# Altium footprint library MyPcbLib.PcbLib: 278 footprints (part 1 of 18)
Each footprint in its own frame and in the unit in brackets; x right, y up, seen from the top. Pads: shape width x height; smd on the part's side, far side on the other; paste and mask are expansions set on the pad; w line width, h text height; cw(c..) or ccw(c..) is an arc to the next point about the centre after c.
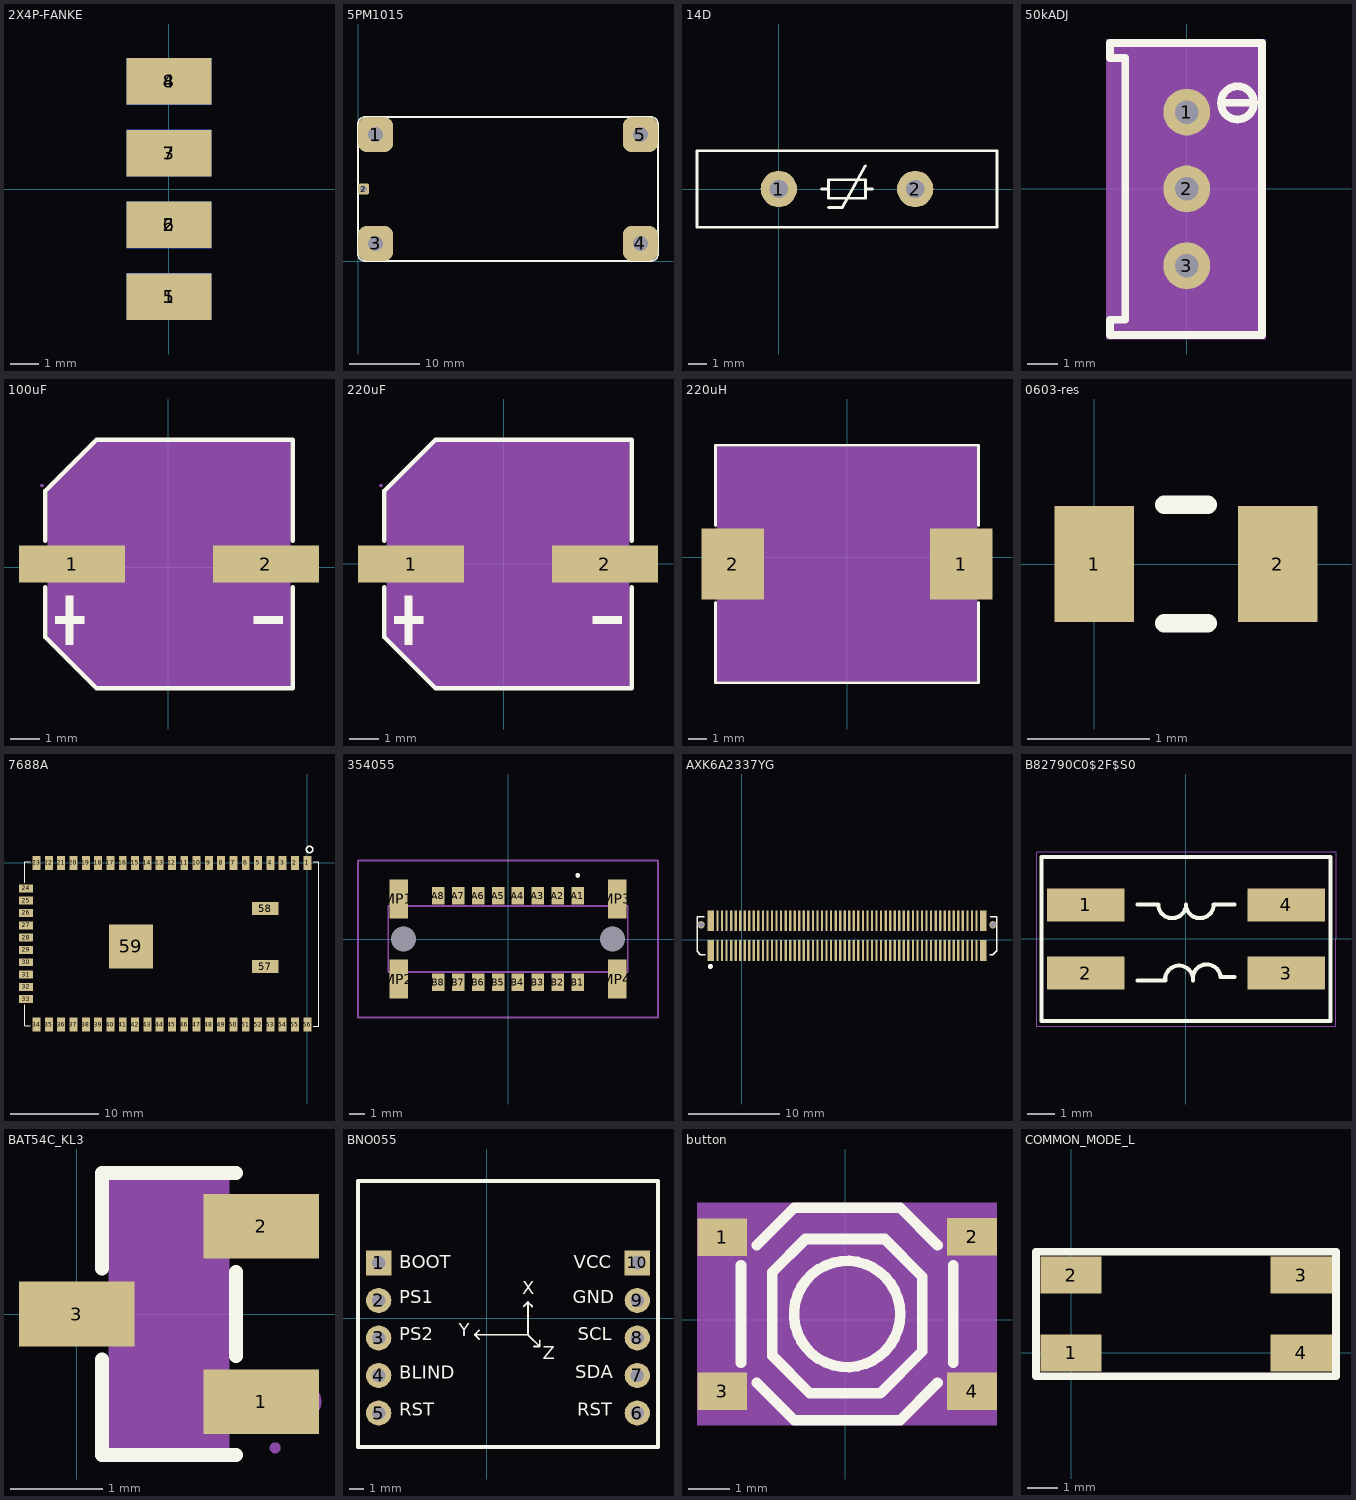
[diagram p0: the footprints below, top view; thin cyan lines are the x and y axes]

## 2X4P-FANKE [mm]
pads (8):
  rect 3x1.65 smd: 1(0,-3.81) 2(0,-1.27) 3(0,1.27) 4(0,3.81)
  rect 3x1.65 smd far side: 5(0,-3.81) 6(0,-1.27) 7(0,1.27) 8(0,3.81)
3D body "User Library-2_54mm Male Header (4x2).STEP": height 1.84, standoff -3.14, extent -1.249,-5.08 10.291,5.08

## 5PM1015 [mm] "5A输出电源模块"
pads (5):
  rrect50% 5x5 hole 2.1: 1(2.5,18) 3(2.5,2.5) 4(40.2,2.5) 5(40.2,18)
  rrect50% 1.6x1.6 hole 1: 2(0.8,10.25)
Top Overlay:
  lines w0.254: 0,1 ccw(c1,1) 1,0 41.7,0 ccw(c41.7,1) 42.7,1 42.7,19.5 ccw(c41.7,19.5) 41.7,20.5 1,20.5 ccw(c1,19.5) 0,19.5 0,1

## 14D [mm]
pads (2):
  round 2 hole 1: 1(0,0) 2(7.5,0)
Top Overlay:
  lines w0.152: 2.353,0 2.734,0 ; 2.734,-1.016 3.496,-1.016 4.766,1.27 ; 4.766,0 5.147,0 ; -4.5,-2.1 12,-2.1 12,2.1 -4.5,2.1 -4.5,-2.1 ; 2.734,-0.508 2.734,0.508 4.766,0.508 4.766,-0.508 2.734,-0.508

## 50kADJ [mil]
pads (3):
  round 60 hole 30: 1(0,98.42) 2(0,0) 3(0,-98.42)
Top Overlay:
  lines w10: 50,110.39 65,110.39 ; 86.2,109.99 cw(c64.99,110.19) 86.2,110.4 ; 96.46,-187.22 -96.46,-187.22 -98.42,-187.22 -98.42,-167.52 -78.74,-167.52 -78.74,167.52 -98.42,167.52 -98.42,187.01 -96.46,187.01 96.46,187.01 96.46,-187.01 ; 65,110.39 80,110.39 65,110.39
Mechanical 4:
  region: -103.42,192.01 101.46,192.01 101.46,-192.22 -103.42,-192.22
Mechanical 5:
  region: -30,-68.42 30,-68.42 30,-128.43 -30,-128.43
  region: -30,128.43 30,128.43 30,68.42 -30,68.42
  region: -30,30 30,30 30,-30 -30,-30
Mechanical 15:
  lines w0.1: -1.98,14.34 0.02,16.34

## 100uF [mm]
pads (2):
  rect 3.61x1.26 smd: 1(-3.275,0.111) 2(3.315,0.111)
Top Overlay:
  region: 3.896,-1.673 3.896,-1.922 2.9,-1.922 2.9,-1.673
  region: -3.856,-1.673 -3.856,-1.922 -2.86,-1.922 -2.86,-1.673
  region: -3.483,-0.968 -3.483,-2.628 -3.234,-2.628 -3.234,-0.968
  lines w0.152: -4.181,-0.671 -4.181,-2.379 -2.445,-4.115 4.221,-4.115 4.221,-0.671 ; -4.181,0.894 -4.181,2.601 -2.445,4.338 4.221,4.338 4.221,0.894
Mechanical 4:
  region: 4.145,4.261 4.145,-4.039 -2.445,-4.039 -4.105,-2.379 -4.105,2.601 -2.445,4.261
Mechanical 5:
  region: 4.52,0.561 4.52,-0.339 1.57,-0.339 1.57,0.561
  region: -4.48,0.561 -4.48,-0.339 -1.53,-0.339 -1.53,0.561
Mechanical 6:
  circle w0.06: c-4.298,2.778 r0.03
Mechanical 15:
  region: 3.896,0.236 3.896,-0.013 2.9,-0.013 2.9,0.236
  region: -3.856,0.236 -3.856,-0.013 -2.86,-0.013 -2.86,0.236
  region: -3.483,0.941 -3.483,-0.719 -3.234,-0.719 -3.234,0.941

## 220uF [mm]
pads (2):
  rect 3.61x1.26 smd: 1(-3.148,-0.016) 2(3.442,-0.016)
Top Overlay:
  region: -3.356,-1.095 -3.356,-2.755 -3.107,-2.755 -3.107,-1.095
  region: -3.729,-1.8 -3.729,-2.049 -2.733,-2.049 -2.733,-1.8
  region: 4.023,-1.8 4.023,-2.049 3.027,-2.049 3.027,-1.8
  lines w0.152: -4.054,-0.798 -4.054,-2.506 -2.318,-4.242 4.348,-4.242 4.348,-0.798 ; -4.054,0.767 -4.054,2.474 -2.318,4.211 4.348,4.211 4.348,0.767
Mechanical 4:
  region: 4.272,4.134 4.272,-4.166 -2.318,-4.166 -3.978,-2.506 -3.978,2.474 -2.318,4.134
Mechanical 5:
  region: -4.353,0.434 -4.353,-0.466 -1.403,-0.466 -1.403,0.434
  region: 4.647,0.434 4.647,-0.466 1.697,-0.466 1.697,0.434
Mechanical 6:
  circle w0.06: c-4.171,2.651 r0.03
Mechanical 15:
  region: -3.356,0.814 -3.356,-0.846 -3.107,-0.846 -3.107,0.814
  region: -3.729,0.109 -3.729,-0.14 -2.733,-0.14 -2.733,0.109
  region: 4.023,0.109 4.023,-0.14 3.027,-0.14 3.027,0.109

## 220uH [mm]
pads (2):
  rect 3.424x3.92 smd: 1(6.267,-0.383) 2(-6.289,-0.383)
Top Overlay:
  lines w0.152: -7.237,-2.495 -7.237,-6.909 7.215,-6.909 7.215,-2.495 ; -7.237,1.73 -7.237,6.144 7.215,6.144 7.215,1.73
Mechanical 4:
  region: -7.161,-6.833 -7.161,6.067 7.139,6.067 7.139,-6.833
Mechanical 5:
  region: 7.139,-2.133 7.139,1.367 4.639,1.367 4.639,-2.133
  region: -7.161,-2.133 -7.161,1.367 -4.661,1.367 -4.661,-2.133
Mechanical 6:
  circle w0.06: c-7.161,-6.833 r0.03
Mechanical 15:
  lines w0.003: -0.036,0.006 0.014,0.056

## 0603-res [mm]
height 0.35
pads (2):
  rect 0.65x0.95 smd: 1(0,0) 2(1.5,0)
Top Overlay:
  lines w0.152: 0.572,-0.483 0.928,-0.483 ; 0.572,0.483 0.928,0.483
3D body "0603-res.step": height 0.35, standoff 0, extent -0.125,-0.475 1.625,0.475

## 7688A [mm]
height 2.5
pads (59):
  rect 0.9x1.6 smd: 1(0,0) 2(-1.4,0) 3(-2.8,0) 4(-4.2,0) 5(-5.6,0) 6(-7,0) 7(-8.4,0) 8(-9.8,0) 9(-11.2,0) 10(-12.6,0) 11(-14,0) 12(-15.4,0) 13(-16.8,0) 14(-18.2,0) 15(-19.6,0) 16(-21,0) 17(-22.4,0) 18(-23.8,0) 19(-25.2,0) 20(-26.6,0) 21(-28,0) 22(-29.4,0) 23(-30.8,0) 34(-30.8,-18.4) 35(-29.4,-18.4) 36(-28,-18.4) 37(-26.6,-18.4) 38(-25.2,-18.4) 39(-23.8,-18.4) 40(-22.4,-18.4) 41(-21,-18.4) 42(-19.6,-18.4) 43(-18.2,-18.4) 44(-16.8,-18.4) 45(-15.4,-18.4) 46(-14,-18.4) 47(-12.6,-18.4) 48(-11.2,-18.4) 49(-9.8,-18.4) 50(-8.4,-18.4) 51(-7,-18.4) 52(-5.6,-18.4) 53(-4.2,-18.4) 54(-2.8,-18.4) 55(-1.4,-18.4) 56(0,-18.4)
  rect 1.6x0.9 smd: 24(-32,-2.9) 25(-32,-4.3) 26(-32,-5.7) 27(-32,-7.1) 28(-32,-8.5) 29(-32,-9.9) 30(-32,-11.3) 31(-32,-12.7) 32(-32,-14.1) 33(-32,-15.5)
  rect 3x1.5 smd: 57(-4.8,-11.8) 58(-4.8,-5.2)
  rect 5x5 smd: 59(-20.066,-9.5)
Top Overlay:
  circle w0.15: c0.254,1.524 r0.359
  lines w0.1: -32.131,-16.129 -32.131,-18.542 -31.496,-18.542 ; -32.131,-2.271 -32.131,0.142 -31.496,0.142 ; 0.696,-18.557 1.331,-18.557 1.331,0.142 0.696,0.142

## 354055 [mm]
pads (22):
  rect 0.8x1.1 smd: A1(4.445,2.75) A2(3.175,2.75) A3(1.905,2.75) A4(0.635,2.75) A5(-0.635,2.75) A6(-1.905,2.75) A7(-3.175,2.75) A8(-4.445,2.75) B1(4.445,-2.75) B2(3.175,-2.75) B3(1.905,-2.75) B4(0.635,-2.75) B5(-0.635,-2.75) B6(-1.905,-2.75) B7(-3.175,-2.75) B8(-4.445,-2.75)
  round 0.8 hole 1.6 unplated: MH1(-6.655,0) MH2(6.655,0)
  rect 1.2x2.5 smd: MP1(-6.955,2.55) MP2(-6.955,-2.55) MP3(6.955,2.55) MP4(6.955,-2.55)
Top Overlay:
  lines w0.2: 4.445,4 ccw(c4.445,4.05) 4.445,4.1 ; 4.445,4 cw(c4.445,4.05) 4.445,4.1 ; 4.445,4 ccw(c4.445,4.05) 4.445,4.1
Mechanical 15:
  lines w0.1: -7.62,-2.1 -7.62,2.1 7.62,2.1 7.62,-2.1 -7.62,-2.1
Bottom Assembly:
  lines w0.1: -9.555,-5 -9.555,5 9.555,5 9.555,-5 -9.555,-5
3D body "354055.stp": height 5.8, standoff -4.65, extent -10,-3.376 10,3.376

## AXK6A2337YG [mm] "AXK6A2337YG-120PIN"
pads (122):
  round 0.8 hole 0.65: 1(-4.475,1.624) 2(27.625,1.624)
  rect 0.75x2.3 smd: 1(-3.425,-1.226) 2(-3.425,2.074) 119(26.575,-1.226) 120(26.575,2.074)
  rect 0.25x2.3 smd: 3(-2.675,-1.226) 4(-2.675,2.074) 5(-2.175,-1.226) 6(-2.175,2.074) 7(-1.675,-1.226) 8(-1.675,2.074) 9(-1.175,-1.226) 10(-1.175,2.074) 11(-0.675,-1.226) 12(-0.675,2.074) 13(-0.175,-1.226) 14(-0.175,2.074) 15(0.325,-1.226) 16(0.325,2.074) 17(0.825,-1.226) 18(0.825,2.074) 19(1.325,-1.226) 20(1.325,2.074) 21(1.825,-1.226) 22(1.825,2.074) 23(2.325,-1.226) 24(2.325,2.074) 25(2.825,-1.226) 26(2.825,2.074) 27(3.325,-1.226) 28(3.325,2.074) 29(3.825,-1.226) 30(3.825,2.074) 31(4.325,-1.226) 32(4.325,2.074) 33(4.825,-1.226) 34(4.825,2.074) 35(5.325,-1.226) 36(5.325,2.074) 37(5.825,-1.226) 38(5.825,2.074) 39(6.325,-1.226) 40(6.325,2.074) 41(6.825,-1.226) 42(6.825,2.074) 43(7.325,-1.226) 44(7.325,2.074) 45(7.825,-1.226) 46(7.825,2.074) 47(8.325,-1.226) 48(8.325,2.074) 49(8.825,-1.226) 50(8.825,2.074) 51(9.325,-1.226) 52(9.325,2.074) 53(9.825,-1.226) 54(9.825,2.074) 55(10.325,-1.226) 56(10.325,2.074) 57(10.825,-1.226) 58(10.825,2.074) 59(11.325,-1.226) 60(11.325,2.074) 61(11.825,-1.226) 62(11.825,2.074) 63(12.325,-1.226) 64(12.325,2.074) 65(12.825,-1.226) 66(12.825,2.074) 67(13.325,-1.226) 68(13.325,2.074) 69(13.825,-1.226) 70(13.825,2.074) 71(14.325,-1.226) 72(14.325,2.074) 73(14.825,-1.226) 74(14.825,2.074) 75(15.325,-1.226) 76(15.325,2.074) 77(15.825,-1.226) 78(15.825,2.074) 79(16.325,-1.226) 80(16.325,2.074) 81(16.825,-1.226) 82(16.825,2.074) 83(17.325,-1.226) 84(17.325,2.074) 85(17.825,-1.226) 86(17.825,2.074) 87(18.325,-1.226) 88(18.325,2.074) 89(18.825,-1.226) 90(18.825,2.074) 91(19.325,-1.226) 92(19.325,2.074) 93(19.825,-1.226) 94(19.825,2.074) 95(20.325,-1.226) 96(20.325,2.074) 97(20.825,-1.226) 98(20.825,2.074) 99(21.325,-1.226) 100(21.325,2.074) 101(21.825,-1.226) 102(21.825,2.074) 103(22.325,-1.226) 104(22.325,2.074) 105(22.825,-1.226) 106(22.825,2.074) 107(23.325,-1.226) 108(23.325,2.074) 109(23.825,-1.226) 110(23.825,2.074) 111(24.325,-1.226) 112(24.325,2.074) 113(24.825,-1.226) 114(24.825,2.074) 115(25.325,-1.226) 116(25.325,2.074) 117(25.825,-1.226) 118(25.825,2.074)
Top Overlay:
  lines w0.152: -4.122,2.524 -4.929,2.524 -4.929,-1.301 -4.554,-1.676 -4.046,-1.676 ; 27.272,-1.676 27.63,-1.676 28.079,-1.227 28.079,2.524 27.349,2.524
  lines w0.254: -3.61,-2.954 ccw(c-3.462,-2.954) -3.61,-2.947
Mechanical 1:
  text "117" at 25.825,-1.988 h0.64
  text "111" at 24.325,-1.988 h0.64
  text "115" at 25.325,-1.988 h0.64
  text "113" at 24.825,-1.988 h0.64
  text "100" at 21.325,1.312 h0.64
  text "9" at -1.203,-0.846 h0.64
  text "10" at -1.175,1.566 h0.64
  text "20" at 1.325,1.566 h0.64
  text "19" at 1.325,-1.734 h0.64
  text "30" at 3.825,1.566 h0.64
  text "29" at 3.825,-1.734 h0.64
  text "39" at 6.325,-1.734 h0.64
  text "49" at 8.825,-1.734 h0.64
  text "50" at 8.825,1.566 h0.64
  text "60" at 11.325,1.566 h0.64
  text "59" at 11.325,-1.734 h0.64
  text "70" at 13.825,1.566 h0.64
  text "69" at 13.825,-1.734 h0.64
  text "80" at 16.325,1.566 h0.64
  text "79" at 16.325,-1.734 h0.64
  text "89" at 18.825,-1.734 h0.64
  text "90" at 18.825,1.566 h0.64
  text "99" at 21.325,-1.734 h0.64
  text "110" at 23.825,1.312 h0.64
  text "109" at 23.825,-1.988 h0.64
  text "40" at 6.325,1.566 h0.64
  text "78" at 15.825,1.566 h0.64
  text "76" at 15.325,1.566 h0.64
  text "74" at 14.825,1.566 h0.64
  text "72" at 14.325,1.566 h0.64
  text "68" at 13.325,1.566 h0.64
  text "66" at 12.825,1.566 h0.64
  text "77" at 15.825,-1.734 h0.64
  text "75" at 15.325,-1.734 h0.64
  text "64" at 12.402,1.576 h0.64
  text "62" at 11.825,1.566 h0.64
  text "58" at 10.825,1.566 h0.64
  text "56" at 10.325,1.566 h0.64
  text "63" at 12.325,-1.734 h0.64
  text "61" at 12.085,-1.598 h0.64
  text "67" at 13.325,-1.734 h0.64
  text "65" at 12.825,-1.734 h0.64
  text "54" at 9.825,1.566 h0.64
  text "52" at 9.325,1.566 h0.64
  text "48" at 8.325,1.566 h0.64
  text "46" at 7.825,1.566 h0.64
  text "57" at 10.825,-1.734 h0.64
  text "55" at 10.325,-1.734 h0.64
  text "53" at 9.825,-1.734 h0.64
  text "51" at 9.325,-1.734 h0.64
  text "47" at 8.325,-1.734 h0.64
  text "45" at 7.825,-1.734 h0.64
  text "41" at 6.825,-1.734 h0.64
  text "27" at 3.325,-1.734 h0.64
  text "25" at 2.825,-1.734 h0.64
  text "23" at 2.325,-1.734 h0.64
  text "21" at 1.825,-1.734 h0.64
  text "43" at 7.325,-1.734 h0.64
  text "31" at 4.325,-1.734 h0.64
  text "33" at 4.825,-1.734 h0.64
  text "42" at 7.082,1.697 h0.64
  text "44" at 7.325,1.566 h0.64
  text "2" at -3.425,2.455 h0.64
  text "4" at -2.493,2.398 h0.64
  text "6" at -2.203,2.454 h0.64
  text "8" at -1.675,2.455 h0.64
  text "5" at -2.175,-0.845 h0.64
  text "1" at -3.425,-0.845 h0.64
  text "3" at -2.675,-0.845 h0.64
  text "7" at -1.735,-0.851 h0.64
  text "112" at 24.325,1.312 h0.64
  text "24" at 2.325,1.566 h0.64
  text "34" at 4.825,1.566 h0.64
  text "22" at 1.825,1.566 h0.64
  text "38" at 5.825,1.566 h0.64
  text "26" at 2.825,1.566 h0.64
  text "36" at 5.325,1.566 h0.64
  text "32" at 4.325,1.566 h0.64
  text "28" at 3.325,1.566 h0.64
  text "18" at 0.825,1.566 h0.64
  text "16" at 0.325,1.566 h0.64
  text "14" at -0.175,1.566 h0.64
  text "12" at -0.675,1.566 h0.64
  text "11" at -0.357,-1.416 h0.64
  text "13" at -0.175,-1.734 h0.64
  text "15" at 0.325,-1.734 h0.64
  text "17" at 0.825,-1.734 h0.64
  text "114" at 24.913,1.325 h0.64
  text "118" at 25.825,1.312 h0.64
  text "116" at 25.325,1.312 h0.64
  text "119" at 26.575,-1.988 h0.64
  text "122" at 27.625,0.862 h0.64
  text "121" at -4.475,0.862 h0.64
  text "120" at 26.575,1.312 h0.64
  text "106" at 22.825,1.312 h0.64
  text "102" at 21.825,1.312 h0.64
  text "83" at 17.325,-1.734 h0.64
  text "105" at 22.825,-1.988 h0.64
  text "81" at 16.825,-1.734 h0.64
  text "87" at 18.325,-1.734 h0.64
  text "104" at 22.325,1.312 h0.64
  text "98" at 20.825,1.566 h0.64
  text "85" at 17.825,-1.734 h0.64
  text "96" at 20.325,1.566 h0.64
  text "107" at 23.325,-1.988 h0.64
  text "93" at 19.836,-1.734 h0.64
  text "108" at 23.325,1.312 h0.64
  text "103" at 22.325,-1.988 h0.64
  text "101" at 21.825,-1.988 h0.64
  text "91" at 19.582,-1.603 h0.64
  text "37" at 5.825,-1.734 h0.64
  text "94" at 19.902,1.576 h0.64
  text "92" at 19.325,1.566 h0.64
  text "86" at 17.825,1.566 h0.64
  text "88" at 18.325,1.566 h0.64
  text "84" at 17.325,1.566 h0.64
  text "82" at 16.825,1.566 h0.64
  text "71" at 14.325,-1.734 h0.64
  text "35" at 5.325,-1.734 h0.64
  text "73" at 14.825,-1.734 h0.64
  text "97" at 20.825,-1.734 h0.64
  text "95" at 20.325,-1.734 h0.64
Mechanical 15:
  lines w0.003: 12.459,0.163 12.51,0.214

## B82790C0$2F$S0 [mm]
height 6
pads (4):
  rect 2.85x1.2 smd mask+0.05: 1(-3.675,1.25) 2(-3.675,-1.25) 3(3.675,-1.25) 4(3.675,1.25)
Top Overlay:
  lines w0.013: -5.3,-3 5.3,-3 5.3,3 -5.3,3 -5.3,-3
  lines w0.15: -1.778,-1.524 -0.762,-1.524 cw(c-0.254,-1.485) 0.254,-1.524 0.254,-1.365 cw(c0.76,-1.444) 1.27,-1.4 1.778,-1.4 ; -1.778,1.27 -1.016,1.27 ccw(c-0.508,1.27) 0,1.27 ccw(c0.508,1.27) 1.016,1.27 1.778,1.27 ; -5.3,-3 5.3,-3 5.3,3 -5.3,3 -5.3,-3
Mechanical 1:
  lines w0.013: -5.5,-3.2 5.5,-3.2 5.5,3.2 -5.5,3.2 -5.5,-3.2

## BAT54C_KL3 [mm]
pads (3):
  rect 1.25x0.7 smd: 1(2,-0.95) 2(2,0.95) 3(0,0)
Top Overlay:
  lines w0.152: 0.274,-0.495 0.274,-1.526 1.726,-1.526 ; 0.274,0.495 0.274,1.526 1.726,1.526 ; 1.726,-0.455 1.726,0.455
Mechanical 4:
  region: 0.35,-1.45 0.35,1.45 1.65,1.45 1.65,-1.45
Mechanical 5:
  region: 1.85,-1.165 1.85,-0.735 2.15,-0.735 2.15,-1.165
  pour cut-out: 1.64,-1.165 1.64,-0.735 1.86,-0.735 1.86,-1.165
  region: 1.85,0.735 1.85,1.165 2.15,1.165 2.15,0.735
  pour cut-out: 1.64,0.735 1.64,1.165 1.86,1.165 1.86,0.735
  region: 0.15,-0.215 0.15,0.215 -0.15,0.215 -0.15,-0.215
  pour cut-out: 0.14,-0.215 0.14,0.215 0.36,0.215 0.36,-0.215
Mechanical 6:
  circle w0.06: c2.15,-1.45 r0.03
Mechanical 15:
  circle w0.2: c2.45,-0.95 r0.1

## BNO055 [mm] "DFROBOT-BNO055模块"
pads (10):
  rect 1.7x1.7 hole 0.9: 1(-7.3,3.76) 10(10.2,3.76)
  round 1.7 hole 0.9: 2(-7.3,1.22) 3(-7.3,-1.32) 4(-7.3,-3.86) 5(-7.3,-6.4) 6(10.2,-6.4) 7(10.2,-3.86) 8(10.2,-1.32) 9(10.2,1.22)
Top Overlay:
  lines w0.127: -0.517,-1.383 -0.8,-1.1 ; -0.517,-0.817 -0.8,-1.1 ; 2.517,0.817 2.8,1.1 ; 3.083,0.817 2.8,1.1 ; 3.2,-1.9 3.6,-1.9 ; 3.6,-1.5 3.6,-1.9 ; -0.8,-1.1 2.8,-1.1 ; 2.8,-1.1 2.8,1.1 ; 2.8,-1.1 3.6,-1.9 ; 3.6,-1.9 3.6,-1.9
  lines w0.254: -8.7,-8.7 -8.7,9.3 11.6,9.3 11.6,-8.7 -8.7,-8.7
  text "PS1" at -5.9,0.717 h1.52
  text "RST" at -5.9,-6.883 h1.52
  text "PS2" at -5.9,-1.766 h1.52
  text "BLIND" at -5.9,-4.383 h1.52
  text "BOOT" at -5.9,3.077 h1.52
  text "GND" at 5.843,0.717 h1.52
  text "SCL" at 6.185,-1.766 h1.52
  text "RST" at 6.136,-6.883 h1.52
  text "VCC" at 5.909,3.077 h1.52
  text "SDA" at 5.985,-4.366 h1.52
  text "Y" at -1.899,-1.5 h1.52
  text "X" at 2.399,1.317 h1.52
  text "Z" at 3.799,-3.083 h1.52
3D body "HDR2.54-1P_M.STEP": height 8.5, standoff -3, extent -8.57,-7.67 -6.03,-5.13
3D body "HDR2.54-1P_M.STEP": height 8.5, standoff -3, extent -8.57,-5.13 -6.03,-2.59
3D body "HDR2.54-1P_M.STEP": height 8.5, standoff -3, extent -8.57,-0.05 -6.03,2.49
3D body "HDR2.54-1P_M.STEP": height 8.5, standoff -3, extent -8.57,2.49 -6.03,5.03
3D body "HDR2.54-1P_M.STEP": height 8.5, standoff -3, extent -8.57,-2.59 -6.03,-0.05
3D body "HDR2.54-1P_M.STEP": height 8.5, standoff -3, extent 8.93,-7.67 11.47,-5.13
3D body "HDR2.54-1P_M.STEP": height 8.5, standoff -3, extent 8.93,-5.13 11.47,-2.59
3D body "HDR2.54-1P_M.STEP": height 8.5, standoff -3, extent 8.93,-0.05 11.47,2.49
3D body "HDR2.54-1P_M.STEP": height 8.5, standoff -3, extent 8.93,2.49 11.47,5.03
3D body "HDR2.54-1P_M.STEP": height 8.5, standoff -3, extent 8.93,-2.59 11.47,-0.05

## button [mm]
pads (4):
  rect 1.2x0.9 smd: 1(-2.949,1.986) 2(3.051,1.988) 3(-2.949,-1.713) 4(3.051,-1.713)
Top Overlay:
  circle w0.254: c0.051,0.137 r1.275
  lines w0.254: -2.499,-1.031 -2.499,1.306 ; -2.119,-1.518 -1.224,-2.413 1.326,-2.413 2.221,-1.518 ; -2.119,1.792 -1.224,2.687 1.326,2.687 2.221,1.792 ; 2.601,-1.031 2.601,1.306 ; -1.75,-0.861 -1.75,1.138 -0.95,1.938 0.95,1.938 1.852,1.036 1.852,-0.762 0.851,-1.763 -0.848,-1.763 -1.75,-0.861
Mechanical 4:
  region: -3.556,2.814 3.65,2.814 3.65,-2.54 -3.556,-2.54
Mechanical 5:
  region: 2.451,-1.262 3.65,-1.262 3.65,-2.164 2.451,-2.164
  region: -3.549,-1.262 -2.35,-1.262 -2.35,-2.164 -3.549,-2.164
  region: 2.451,2.438 3.65,2.438 3.65,1.537 2.451,1.537
  region: -3.549,2.436 -2.35,2.436 -2.35,1.537 -3.549,1.537

## COMMON_MODE_L [mm]
pads (4):
  rect 2x1.2 smd: 1(0,0) 2(0,2.54) 3(7.5,2.54) 4(7.5,0)
Top Overlay:
  lines w0.254: -1.143,-0.762 -1.143,3.302 8.636,3.302 8.636,-0.762 -1.143,-0.762